# Altium footprint library IC.PcbLib: 386 footprints (part 14 of 30)
Each footprint in its own frame and in the unit in brackets; x right, y up, seen from the top. Pads: shape width x height; smd on the part's side, far side on the other; paste and mask are expansions set on the pad; w line width, h text height; cw(c..) or ccw(c..) is an arc to the next point about the centre after c.
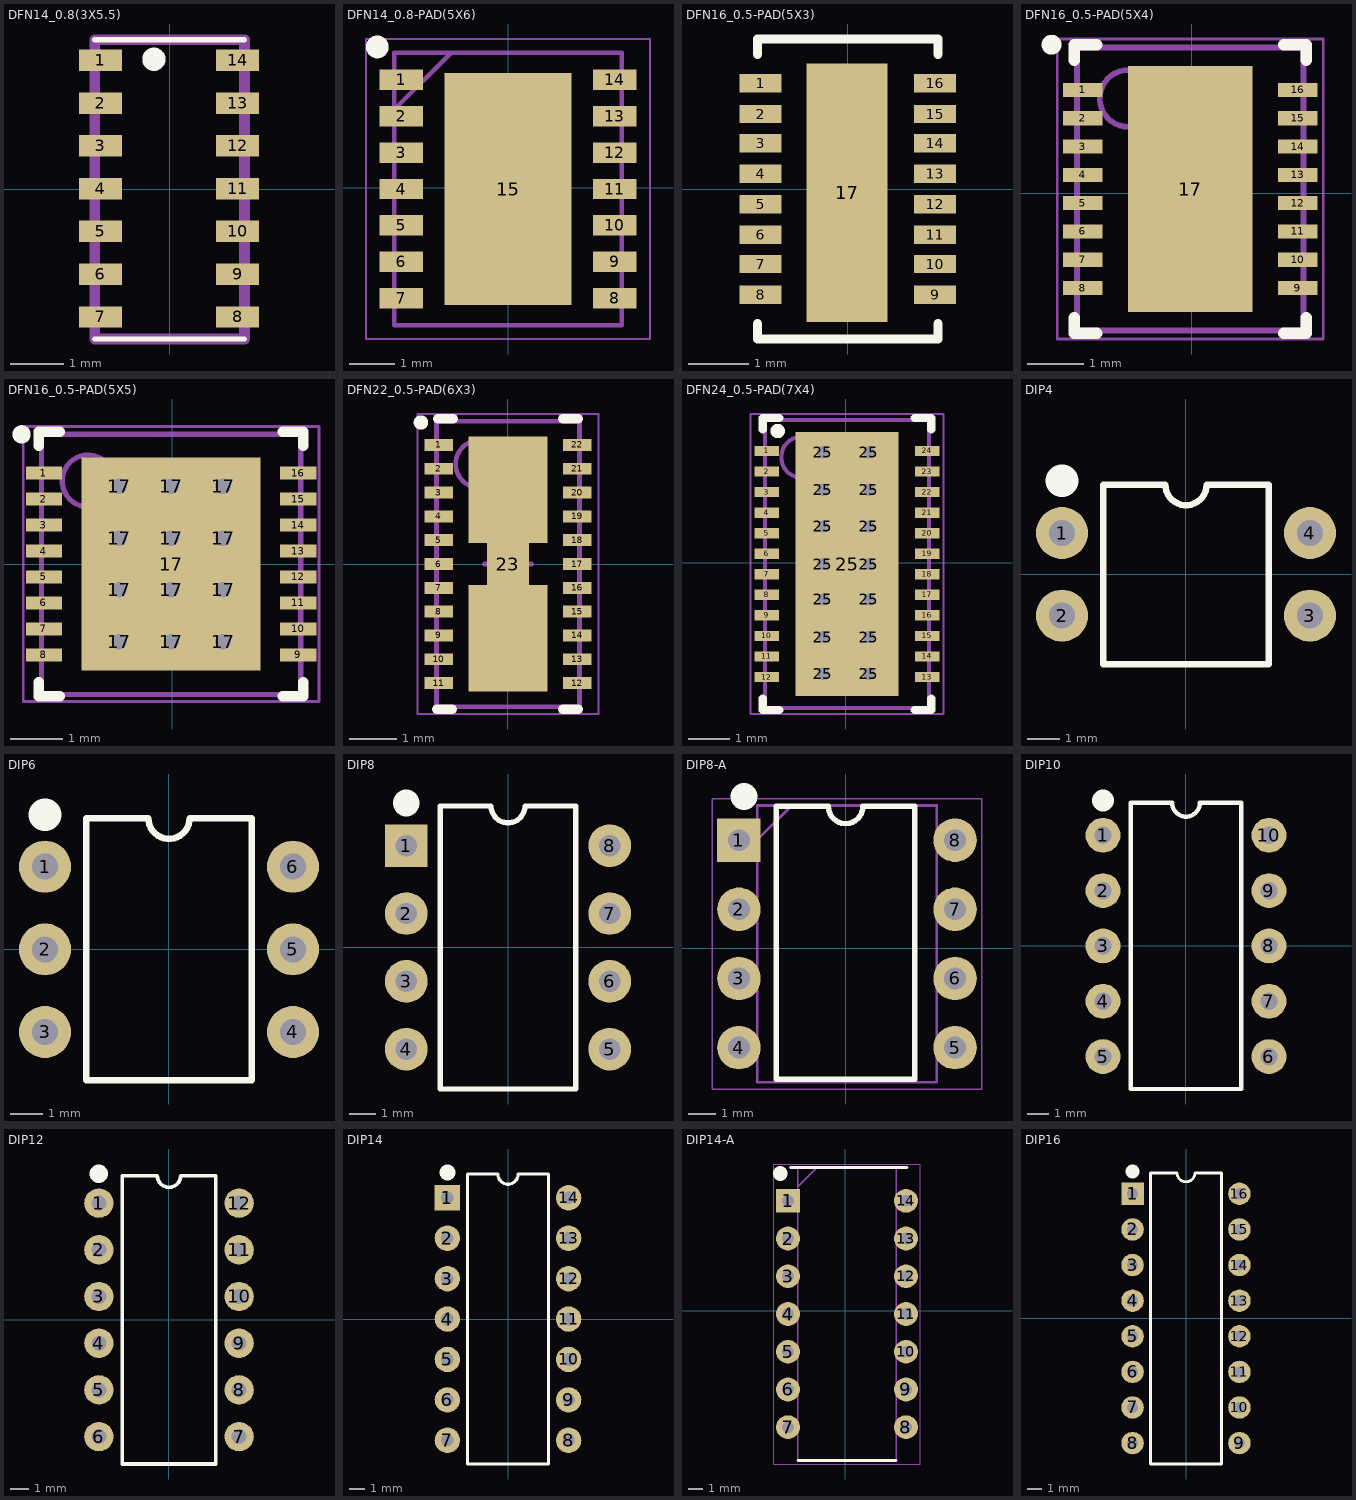
[diagram p13: the footprints below, top view; thin cyan lines are the x and y axes]

## DFN14_0.8(3X5.5) [mm]
pads (14):
  rect 0.8x0.4 smd: 1(-1.295,2.412) 2(-1.295,1.612) 3(-1.295,0.812) 4(-1.295,0.012) 5(-1.295,-0.788) 6(-1.295,-1.588) 7(-1.295,-2.388) 8(1.27,-2.388) 9(1.27,-1.588) 10(1.27,-0.788) 11(1.27,0.012) 12(1.27,0.812) 13(1.27,1.612) 14(1.27,2.412)
Top Overlay:
  circle w0.254: c-0.295,2.434 r0.092
  lines w0.1: -1.4,-2.8 1.4,-2.8 ; -1.4,2.8 1.4,2.8
Mechanical 13:
  lines w0.2: -1.4,-2.8 1.4,-2.8 1.4,2.8 -1.4,2.8 -1.4,-2.8
3D body "User Library-MAX30100.STEP": height 1.28, standoff 0, extent -1.374,-2.749 1.426,2.851

## DFN14_0.8-PAD(5X6) [mm]
pads (15):
  rect 0.95x0.45 smd: 1(-2.35,2.375) 2(-2.35,1.575) 3(-2.35,0.775) 4(-2.35,-0.025) 5(-2.35,-0.825) 6(-2.35,-1.625) 7(-2.35,-2.425) 8(2.35,-2.425) 9(2.35,-1.625) 10(2.35,-0.825) 11(2.35,-0.025) 12(2.35,0.775) 13(2.35,1.575) 14(2.35,2.375)
  rect 2.794x5.1 smd: 15(0,-0.025)
Top Overlay:
  circle w0.25: c-2.875,3.1 r0.125
Mechanical 13:
  lines w0.1: -2.5,1.725 -1.25,2.975 ; -2.5,-3.025 2.5,-3.025 2.5,2.975 -2.5,2.975 -2.5,-3.025
Mechanical 15:
  lines w0.05: -3.125,-3.325 3.125,-3.325 3.125,3.275 -3.125,3.275 -3.125,-3.325
3D body "LM2676SD-ADJ_NOPB.stp": height 1, standoff 0, extent -2.55,-3.025 2.55,2.975

## DFN16_0.5-PAD(5X3) [mil]
pads (17):
  rect 27.56x12 smd: 1(-57,69) 2(-57,49) 3(-57,30) 4(-57,10) 5(-57,-10) 6(-57,-30) 7(-57,-49) 8(-57,-69) 9(57,-69) 10(57,-49) 11(57,-30) 12(57,-10) 13(57,10) 14(57,30) 15(57,49) 16(57,69)
  rect 53.15x169 smd: 17(-0.5,-2.5)
Top Overlay:
  lines w6: -59,-88 -59,-98 59,-98 59,-88 ; -59,88 -59,98 59,98 59,88
3D body "User Library-My-DFN-16-5x3-0_5.STEP": height 31.5, standoff 0, extent -60.41,-100.07 62.42,100.71

## DFN16_0.5-PAD(5X4) [mm]
pads (17):
  rect 0.7x0.25 smd: 1(-1.925,1.826) 2(-1.925,1.326) 3(-1.925,0.826) 4(-1.925,0.326) 5(-1.925,-0.174) 6(-1.925,-0.674) 7(-1.925,-1.174) 8(-1.925,-1.674) 9(1.875,-1.674) 10(1.875,-1.174) 11(1.875,-0.674) 12(1.875,-0.174) 13(1.875,0.326) 14(1.875,0.826) 15(1.875,1.326) 16(1.875,1.826)
  rect 2.2x4.34 smd: 17(-0.025,0.076)
Top Overlay:
  circle w0.25: c-2.475,2.626 r0.05
  lines w0.2: -2.075,-2.199 -2.075,-2.474 -1.675,-2.474 ; -2.075,2.351 -2.075,2.626 -1.675,2.626 ; 1.625,-2.474 2.025,-2.474 2.025,-2.199 ; 1.625,2.626 2.025,2.626 2.025,2.351
Mechanical 13:
  circle w0.1: c-1.125,1.676 r0.5
  lines w0.1: -2.025,-2.424 -2.025,2.576 1.975,2.576 1.975,-2.424 -2.025,-2.424
Mechanical 15:
  lines w0.05: -2.375,-2.574 -2.375,2.726 2.325,2.726 2.325,-2.574 -2.375,-2.574
  lines w0.1: -0.525,0.076 0.475,0.076 ; -0.025,-0.424 -0.025,0.576
3D body "User Library-My-DFN-16-5x4-0_5.STEP": height 0.8, standoff 0, extent -2.085,-2.474 2.035,2.626

## DFN16_0.5-PAD(5X5) [mm]
pads (29):
  rect 0.7x0.25 smd: 1(-2.475,1.75) 2(-2.475,1.25) 3(-2.475,0.75) 4(-2.475,0.25) 5(-2.475,-0.25) 6(-2.475,-0.75) 7(-2.475,-1.25) 8(-2.475,-1.75) 9(2.425,-1.75) 10(2.425,-1.25) 11(2.425,-0.75) 12(2.425,-0.25) 13(2.425,0.25) 14(2.425,0.75) 15(2.425,1.25) 16(2.425,1.75)
  round 0.6 hole 0.3: 17(-1.025,-1.5) 17(-1.025,-0.5) 17(-1.025,0.5) 17(-1.025,1.5) 17(-0.025,-1.5) 17(-0.025,-0.5) 17(-0.025,0.5) 17(-0.025,1.5) 17(0.975,-1.5) 17(0.975,-0.5) 17(0.975,0.5) 17(0.975,1.5)
  rect 3.45x4.1 smd: 17(-0.025,0)
Top Overlay:
  circle w0.25: c-2.907,2.499 r0.05
  lines w0.2: -2.575,-2.275 -2.575,-2.55 -2.175,-2.55 ; -2.575,2.275 -2.575,2.55 -2.175,2.55 ; 2.125,-2.55 2.525,-2.55 2.525,-2.275 ; 2.125,2.55 2.525,2.55 2.525,2.275
Mechanical 13:
  circle w0.1: c-1.625,1.6 r0.5
  lines w0.1: -2.525,-2.515 2.475,-2.515 2.475,2.5 -2.525,2.5 -2.525,-2.515
Mechanical 15:
  lines w0.05: -2.875,-2.65 2.825,-2.65 2.825,2.65 -2.875,2.65 -2.875,-2.65
  lines w0.1: -0.525,0 0.475,0 ; -0.025,-0.5 -0.025,0.5
3D body "User Library-My-DFN-16-5x5-0_5.STEP": height 0.8, standoff 0, extent -2.585,-2.55 2.535,2.55

## DFN22_0.5-PAD(6X3) [mm]
pads (25):
  rect 0.6x0.25 smd: 1(-1.45,2.5) 2(-1.45,2) 3(-1.45,1.5) 4(-1.45,1) 5(-1.45,0.5) 6(-1.45,0) 7(-1.45,-0.5) 8(-1.45,-1) 9(-1.45,-1.5) 10(-1.45,-2) 11(-1.45,-2.5) 12(1.45,-2.5) 13(1.45,-2) 14(1.45,-1.5) 15(1.45,-1) 16(1.45,-0.5) 17(1.45,0) 18(1.45,0.5) 19(1.45,1) 20(1.45,1.5) 21(1.45,2) 22(1.45,2.5)
  rect 0.889x0.889 smd: 23(0,0)
  rect 1.65x2.231 smd: ""(0,-1.56) ""(0,1.56)
Top Overlay:
  circle w0.2: c-1.829,2.972 r0.051
  lines w0.2: -1.499,-3.048 -1.174,-3.048 ; -1.473,3.048 -1.148,3.048 ; 1.148,-3.048 1.473,-3.048 ; 1.148,3.048 1.473,3.048
Mechanical 13:
  circle w0.1: c-0.6,2.1 r0.5
  lines w0.1: -1.5,-3 1.5,-3 1.5,3 -1.5,3 -1.5,-3
Mechanical 15:
  lines w0.05: -1.9,-3.15 1.9,-3.15 1.9,3.15 -1.9,3.15 -1.9,-3.15
  lines w0.1: -0.5,0 0.5,0 ; 0,-0.5 0,0.5
3D body "SON50P300X80_HS-23N.step": height 0.8, standoff 0, extent -1.6,-3.003 1.6,2.997

## DFN24_0.5-PAD(7X4) [mm]
pads (39):
  rect 0.6x0.25 smd mask+0.102: 1(-1.925,2.725) 2(-1.925,2.225) 3(-1.925,1.725) 4(-1.925,1.225) 5(-1.925,0.725) 6(-1.925,0.225) 7(-1.925,-0.275) 8(-1.925,-0.775) 9(-1.925,-1.275) 10(-1.925,-1.775) 11(-1.925,-2.275) 12(-1.925,-2.775) 13(1.976,-2.775) 14(1.976,-2.275) 15(1.976,-1.775) 16(1.976,-1.275) 17(1.976,-0.775) 18(1.976,-0.275) 19(1.976,0.225) 20(1.976,0.725) 21(1.976,1.225) 22(1.976,1.725) 23(1.976,2.225) 24(1.976,2.725)
  round 0.6 hole 0.3: 25(-0.559,-2.692) 25(-0.559,-1.803) 25(-0.559,-0.889) 25(-0.559,-0.025) 25(-0.559,0.889) 25(-0.559,1.778) 25(-0.559,2.692) 25(0.559,-2.692) 25(0.559,-1.803) 25(0.559,-0.889) 25(0.559,-0.025) 25(0.559,0.889) 25(0.559,1.778) 25(0.559,2.692)
  rect 2.5x6.43 smd: 25(0.025,-0.025)
Top Overlay:
  circle w0.25: c-1.663,3.21 r0.05
  lines w0.2: -2.025,-3.3 -2.025,-3.575 -1.625,-3.575 ; -2.025,3.25 -2.025,3.525 -1.625,3.525 ; 1.675,-3.575 2.075,-3.575 2.075,-3.3 ; 1.675,3.525 2.075,3.525 2.075,3.25
Mechanical 13:
  circle w0.1: c-1.075,2.575 r0.5
  lines w0.1: -1.975,-3.525 -1.975,3.475 2.025,3.475 2.025,-3.525 -1.975,-3.525
Mechanical 15:
  lines w0.05: -2.325,-3.675 -2.325,3.625 2.375,3.625 2.375,-3.675 -2.325,-3.675
  lines w0.1: -0.475,-0.025 0.525,-0.025 ; 0.025,-0.525 0.025,0.475
3D body "LT8582EDKD#TRPBF.stp": height 0.8, standoff 0, extent -1.999,-3.525 2.101,3.475

## DIP4 [mm]
pads (4):
  round 1.6 hole 0.8: 1(-3.81,1.27) 2(-3.81,-1.27) 3(3.81,-1.27) 4(3.81,1.27)
Top Overlay:
  lines w0.2: -2.54,-2.76 -2.54,2.76 -0.635,2.76 ccw(c0,2.76) 0.635,2.76 2.54,2.76 2.54,-2.76 -2.54,-2.76
  lines w1: -3.811,2.871 -3.81,2.87
3D body "DIP4.STEP": height 4.31, standoff -3.28, extent -4,-2.845 4,2.695

## DIP6 [mm]
pads (6):
  round 1.6 hole 0.8: 1(-3.81,2.54) 2(-3.81,0) 3(-3.81,-2.54) 4(3.81,-2.54) 5(3.81,0) 6(3.81,2.54)
Top Overlay:
  lines w0.2: -2.54,-4.03 -2.54,4.03 -0.635,4.03 ccw(c0,4.03) 0.635,4.03 2.54,4.03 2.54,-4.03 -2.54,-4.03
  lines w1: -3.811,4.141 -3.81,4.14
3D body "DIP6.STEP": height 4.5, standoff -2.8, extent -3.935,-3.56 3.935,3.56

## DIP8 [mm]
pads (8):
  rect 1.6x1.6 hole 0.8: 1(-3.81,3.81)
  round 1.6 hole 0.8: 2(-3.81,1.27) 3(-3.81,-1.27) 4(-3.81,-3.81) 5(3.81,-3.81) 6(3.81,-1.27) 7(3.81,1.27) 8(3.81,3.81)
Top Overlay:
  lines w0.2: -2.54,-5.3 -2.54,5.3 -0.635,5.3 ccw(c0,5.3) 0.635,5.3 2.54,5.3 2.54,-5.3 -2.54,-5.3
  lines w1: -3.811,5.411 -3.81,5.41
3D body "DIP-8.STEP": height 4.57, standoff -3.81, extent -3.91,-4.955 3.91,4.955

## DIP8-A [mm]
pads (8):
  rect 1.6x1.6 hole 0.8: 1(-3.919,3.962)
  round 1.6 hole 0.8: 2(-3.919,1.422) 3(-3.919,-1.118) 4(-3.919,-3.658) 5(4.021,-3.658) 6(4.021,-1.118) 7(4.021,1.422) 8(4.021,3.962)
Top Overlay:
  lines w0.2: -2.54,-4.817 2.54,-4.817 2.54,5.207 0.635,5.207 cw(c0,5.207) -0.635,5.207 -2.54,5.207 -2.54,-4.817
  lines w1: -3.734,5.563 -3.733,5.562
Mechanical 13:
  lines w0.1: -3.249,3.962 -1.979,5.232 ; -3.249,-4.928 -3.249,5.232 3.351,5.232 3.351,-4.928 -3.249,-4.928
Mechanical 15:
  lines w0.05: -4.894,-5.178 -4.894,5.482 4.996,5.482 4.996,-5.178 -4.894,-5.178
3D body "NE5532AP.stp": height 5.08, standoff -3.5, extent -4.052,-4.643 4.153,4.947

## DIP10 [mm]
pads (10):
  round 1.6 hole 0.8: 1(-3.81,5.08) 2(-3.81,2.54) 3(-3.81,0) 4(-3.81,-2.54) 5(-3.81,-5.08) 6(3.81,-5.08) 7(3.81,-2.54) 8(3.81,0) 9(3.81,2.54) 10(3.81,5.08)
Top Overlay:
  lines w0.2: -2.54,-6.57 -2.54,6.57 -0.635,6.57 ccw(c0,6.57) 0.635,6.57 2.54,6.57 2.54,-6.57 -2.54,-6.57
  lines w1: -3.811,6.681 -3.81,6.68
3D body "HDR1X5.STEP": height 4.4, standoff -2.97, extent 2.54,-6.375 5.08,6.325
3D body "HDR1X5.STEP": height 4.4, standoff -2.97, extent -5.08,-6.375 -2.54,6.325

## DIP12 [mm]
pads (12):
  round 1.6 hole 0.8: 1(-3.81,6.35) 2(-3.81,3.81) 3(-3.81,1.27) 4(-3.81,-1.27) 5(-3.81,-3.81) 6(-3.81,-6.35) 7(3.81,-6.35) 8(3.81,-3.81) 9(3.81,-1.27) 10(3.81,1.27) 11(3.81,3.81) 12(3.81,6.35)
Top Overlay:
  lines w0.2: 2.54,-7.84 -2.54,-7.84 -2.54,7.84 -0.635,7.84 ccw(c0,7.84) 0.635,7.84 2.54,7.84 2.54,-7.84 ; 2.54,-7.84 2.54,-7.84
  lines w1: -3.811,7.951 -3.81,7.95
3D body "HDR1X6.STEP": height 4.4, standoff -2.97, extent -5.105,-7.645 -2.565,7.595
3D body "HDR1X6.STEP": height 4.4, standoff -2.97, extent 2.515,-7.645 5.055,7.595

## DIP14 [mm]
pads (14):
  rect 1.6x1.6 hole 0.8: 1(-3.81,7.62)
  round 1.6 hole 0.8: 2(-3.81,5.08) 3(-3.81,2.54) 4(-3.81,0) 5(-3.81,-2.54) 6(-3.81,-5.08) 7(-3.81,-7.62) 8(3.81,-7.62) 9(3.81,-5.08) 10(3.81,-2.54) 11(3.81,0) 12(3.81,2.54) 13(3.81,5.08) 14(3.81,7.62)
Top Overlay:
  lines w0.2: 2.54,-9.11 -2.54,-9.11 -2.54,9.11 -0.635,9.11 ccw(c0,9.11) 0.635,9.11 2.54,9.11 2.54,-9.11 ; 2.54,-9.11 2.54,-9.11
  lines w1: -3.811,9.221 -3.81,9.22
3D body "DIP14.STEP": height 4.5, standoff -3.5, extent -3.88,-9.05 3.88,9.05

## DIP14-A [mm]
pads (14):
  rect 1.6x1.6 hole 0.8: 1(-3.843,7.391)
  round 1.6 hole 0.8: 2(-3.843,4.851) 3(-3.843,2.311) 4(-3.843,-0.229) 5(-3.843,-2.769) 6(-3.843,-5.309) 7(-3.843,-7.849) 8(4.097,-7.849) 9(4.097,-5.309) 10(4.097,-2.769) 11(4.097,-0.229) 12(4.097,2.311) 13(4.097,4.851) 14(4.097,7.391)
Top Overlay:
  lines w0.2: -3.683,9.627 4.152,9.627 ; -3.173,-10.074 3.427,-10.074
  lines w1: -4.37,9.221 -4.369,9.22
Mechanical 13:
  lines w0.1: -3.173,8.346 -1.903,9.616 ; -3.173,-10.074 -3.173,9.616 3.427,9.616 3.427,-10.074 -3.173,-10.074
Mechanical 15:
  lines w0.05: -4.818,-10.324 -4.818,9.866 5.072,9.866 5.072,-10.324 -4.818,-10.324
3D body "LM324AN.stp": height 5.08, standoff -3.5, extent -3.975,-9.881 4.229,9.424

## DIP16 [mm]
pads (16):
  rect 1.6x1.6 hole 0.8: 1(-3.81,8.89)
  round 1.6 hole 0.8: 2(-3.81,6.35) 3(-3.81,3.81) 4(-3.81,1.27) 5(-3.81,-1.27) 6(-3.81,-3.81) 7(-3.81,-6.35) 8(-3.81,-8.89) 9(3.81,-8.89) 10(3.81,-6.35) 11(3.81,-3.81) 12(3.81,-1.27) 13(3.81,1.27) 14(3.81,3.81) 15(3.81,6.35) 16(3.81,8.89)
Top Overlay:
  lines w0.2: 2.54,-10.38 2.54,-10.38 ; 2.54,-10.38 -2.54,-10.38 -2.54,10.38 -0.635,10.38 ccw(c0,10.38) 0.635,10.38 2.54,10.38 2.54,-10.38
  lines w1: -3.81,10.49 -3.81,10.491
3D body "DIP16.STEP": height 4.19, standoff -2.57, extent -3.937,-10.795 3.937,10.795